# Altium schematic symbol library IC_ADI.SCHLIB: 3169 symbols (part 39 of 181) (continued)
## AD6657BBCZ (continued)

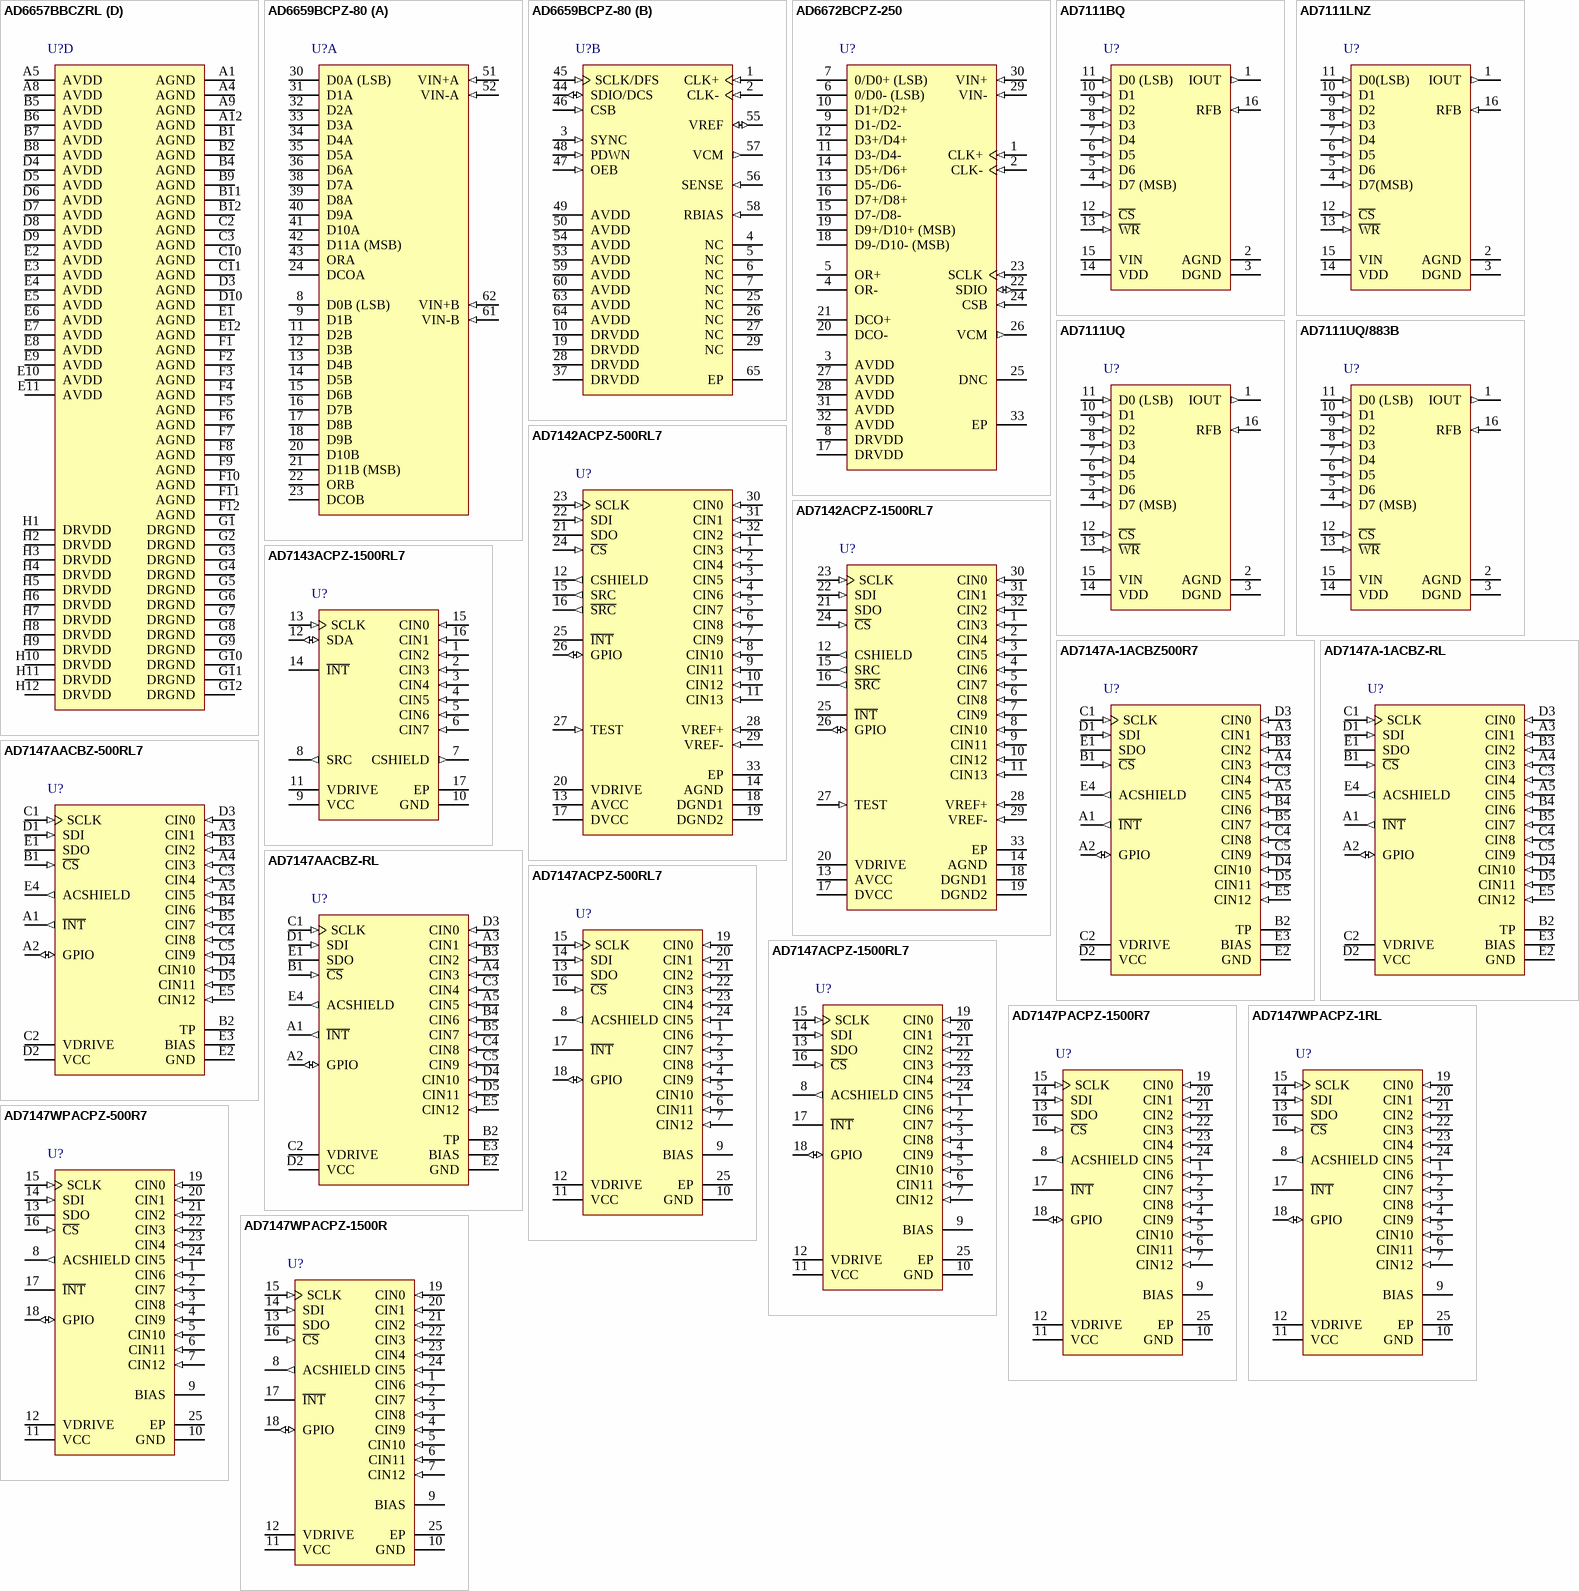
[diagram p35: symbols AD6657BBCZRL to AD7147WPACPZ-1500R]

## AD6657BBCZRL
designator U?
Quad 11-Bit IF Receiver with LVDS, Parallel Interface, 200MSPS, -40 to +85 degC, BC-144-1, Pb-Free, Reel; Generic Part Number: AD6657; PartNumber: AD6657BBCZRL; Resolution (Bits): 11; Channels: 4; Throughput Rate (SPS): 200M; DatasheetVersion: Rev.B; PackageVersion: 012006-0; PackageReference: BC-144-1; PackageDescription: 144-Ball Chip Scale Package Ball Grid Array [CSP_BGA]; Supplier Part Number 1: AD6657BBCZRL-ND; Supplier Part Number 2: 584-AD6657BBCZR; Interface: LVDS, Par; RoHS: Y; Packing: Reel; Mounting Technology: Surface Mount; Code_JEDEC: MO-205-AC; ComponentLink1Description: Manufacturer URL; ComponentLink2Description: Datasheet; ComponentLink3Description: Package Specification; ComponentLink4Description: Product URL
footprint BGA144_0.8(10X10) (Footprint not found)
part A pins: A10 VIN-B (in) "Differential Analog Input Pin (-) for Channel B", A11 VIN+B (in) "Differential Analog Input Pin (+) for Channel B", B10 VCMB (out) "Common-Mode Level Bias Output for Analog Input Channel B", C12 VIN+A (in) "Differential Analog Input Pin (+) for Channel A", D11 VCMA (out) "Common-Mode Level Bias Output for Analog Input Channel A", D12 VIN-A (in) "Differential Analog Input Pin (-) for Channel A", J7 D0-AB (hiz) "Channel A and Channel B LVDS Output Data 0--Complement", J8 D2-AB (hiz) "Channel A and Channel B LVDS Output Data 2--Complement", J9 D4-AB (hiz) "Channel A and Channel B LVDS Output Data 4--Complement", J10 D6-AB (hiz) "Channel A and Channel B LVDS Output Data 6--Complement", J11 D8-AB (hiz) "Channel A and Channel B LVDS Output Data 8--Complement", J12 D10-AB (hiz) "Channel A and Channel B LVDS Output Data 10--Complement", K7 D0+AB (hiz) "Channel A and Channel B LVDS Output Data 0--True", K8 D2+AB (hiz) "Channel A and Channel B LVDS Output Data 2--True", K9 D4+AB (hiz) "Channel A and Channel B LVDS Output Data 4--True", K10 D6+AB (hiz) "Channel A and Channel B LVDS Output Data 6--True", K11 D8+AB (hiz) "Channel A and Channel B LVDS Output Data 6--True", K12 D10+AB (hiz) "Channel A and Channel B LVDS Output Data 6--True", L7 D1-AB (hiz) "Channel A and Channel B LVDS Output Data 1--Complement", L8 D3-AB (hiz) "Channel A and Channel B LVDS Output Data 3--Complement", L9 D5-AB (hiz) "Channel A and Channel B LVDS Output Data 5--Complement", L10 D7-AB (hiz) "Channel A and Channel B LVDS Output Data 7--Complement", L11 D9-AB (hiz) "Channel A and Channel B LVDS Output Data 9--Complement", L12 DCO-AB (hiz) "Data Clock LVDS Output for Channel A and Channel B--Complement", M7 D1+AB (hiz) "Channel A and Channel B LVDS Output Data 1--True", M8 D3+AB (hiz) "Channel A and Channel B LVDS Output Data 3--True", M9 D5+AB (hiz) "Channel A and Channel B LVDS Output Data 5--True", M10 D7+AB (hiz) "Channel A and Channel B LVDS Output Data 7--True", M11 D9+AB (hiz) "Channel A and Channel B LVDS Output Data 9--True", M12 DCO+AB (hiz) "Data Clock LVDS Output for Channel A and Channel B--True"
part B pins: A2 VIN+C (in) "Differential Analog Input Pin (+) for Channel C", A3 VIN-C (in) "Differential Analog Input Pin (-) for Channel C", B3 VCMC (out) "Common-Mode Level Bias Output for Analog Input Channel C", C1 VIN+D (in) "Differential Analog Input Pin (+) for Channel D", D1 VIN-D (in) "Differential Analog Input Pin (-) for Channel D", D2 VCMD (out) "Common-Mode Level Bias Output for Analog Input Channel D", J1 D0-CD (hiz) "Channel C and Channel D LVDS Output Data 0--Complement", J2 D2-CD (hiz) "Channel C and Channel D LVDS Output Data 2--Complement", J3 D4-CD (hiz) "Channel C and Channel D LVDS Output Data 4--Complement", J4 D6-CD (hiz) "Channel C and Channel D LVDS Output Data 6--Complement", J5 D8-CD (hiz) "Channel C and Channel D LVDS Output Data 8--Complement", J6 D10-CD (hiz) "Channel C and Channel D LVDS Output Data 10--Complement", K1 D0+CD (hiz) "Channel C and Channel D LVDS Output Data 0--True", K2 D2+CD (hiz) "Channel C and Channel D LVDS Output Data 2--True", K3 D4+CD (hiz) "Channel C and Channel D LVDS Output Data 4--True", K4 D6+CD (hiz) "Channel C and Channel D LVDS Output Data 6--True", K5 D8+CD (hiz) "Channel C and Channel D LVDS Output Data 8--True", K6 D10+CD (hiz) "Channel C and Channel D LVDS Output Data 10--True", L1 D1-CD (hiz) "Channel C and Channel D LVDS Output Data 1--Complement", L2 D3-CD (hiz) "Channel C and Channel D LVDS Output Data 3--Complement", L3 D5-CD (hiz) "Channel C and Channel D LVDS Output Data 5--Complement", L4 D7-CD (hiz) "Channel C and Channel D LVDS Output Data 7--Complement", L5 D9-CD (hiz) "Channel C and Channel D LVDS Output Data 9--Complement", L6 DCO-CD (hiz) "Data Clock LVDS Output for Channel C and Channel D--Complement", M1 D1+CD (hiz) "Channel C and Channel D LVDS Output Data 1--True", M2 D3+CD (hiz) "Channel C and Channel D LVDS Output Data 3--True", M3 D5+CD (hiz) "Channel C and Channel D LVDS Output Data 5--True", M4 D7+CD (hiz) "Channel C and Channel D LVDS Output Data 7--True", M5 D9+CD (hiz) "Channel C and Channel D LVDS Output Data 9--True", M6 DCO+CD (hiz) "Data Clock LVDS Output for Channel C and Channel D--True"
part C pins: A6 CLK- (in) "ADC Clock Input--Complement", A7 CLK+ (in) "ADC Clock Input--True", C4 CSB (in) "SPI Chip Select (Active Low)", C5 SDIO (io) "SPI Data", C6 SCLK (in) "SPI Clock", C7 PDWN (in) "Power-Down Input (Active High)", C8 SYNC (in) "Digital Synchronization Pin", C9 MODE (in) "Mode Select Pin (Logic Low Enables NSR; Logic High Disables NSR)"
part D pins: A1 AGND (power) "Analog Ground", A4 AGND (power) "Analog Ground", A5 AVDD (power) "Analog Power Supply (1.8 V Nominal)", A8 AVDD (power) "Analog Power Supply (1.8 V Nominal)", A9 AGND (power) "Analog Ground", A12 AGND (power) "Analog Ground", B1 AGND (power) "Analog Ground", B2 AGND (power) "Analog Ground", B4 AGND (power) "Analog Ground", B5 AVDD (power) "Analog Power Supply (1.8 V Nominal)", B6 AVDD (power) "Analog Power Supply (1.8 V Nominal)", B7 AVDD (power) "Analog Power Supply (1.8 V Nominal)", B8 AVDD (power) "Analog Power Supply (1.8 V Nominal)", B9 AGND (power) "Analog Ground", B11 AGND (power) "Analog Ground", B12 AGND (power) "Analog Ground", C2 AGND (power) "Analog Ground", C3 AGND (power) "Analog Ground", C10 AGND (power) "Analog Ground", C11 AGND (power) "Analog Ground", D3 AGND (power) "Analog Ground", D4 AVDD (power) "Analog Power Supply (1.8 V Nominal)", D5 AVDD (power) "Analog Power Supply (1.8 V Nominal)", D6 AVDD (power) "Analog Power Supply (1.8 V Nominal)", D7 AVDD (power) "Analog Power Supply (1.8 V Nominal)", D8 AVDD (power) "Analog Power Supply (1.8 V Nominal)", D9 AVDD (power) "Analog Power Supply (1.8 V Nominal)", D10 AGND (power) "Analog Ground", E1 AGND (power) "Analog Ground", E2 AVDD (power) "Analog Power Supply (1.8 V Nominal)", E3 AVDD (power) "Analog Power Supply (1.8 V Nominal)", E4 AVDD (power) "Analog Power Supply (1.8 V Nominal)", E5 AVDD (power) "Analog Power Supply (1.8 V Nominal)", E6 AVDD (power) "Analog Power Supply (1.8 V Nominal)", E7 AVDD (power) "Analog Power Supply (1.8 V Nominal)", E8 AVDD (power) "Analog Power Supply (1.8 V Nominal)", E9 AVDD (power) "Analog Power Supply (1.8 V Nominal)", E10 AVDD (power) "Analog Power Supply (1.8 V Nominal)", E11 AVDD (power) "Analog Power Supply (1.8 V Nominal)", E12 AGND (power) "Analog Ground", F1 AGND (power) "Analog Ground", F2 AGND (power) "Analog Ground", F3 AGND (power) "Analog Ground", F4 AGND (power) "Analog Ground", F5 AGND (power) "Analog Ground", F6 AGND (power) "Analog Ground", F7 AGND (power) "Analog Ground", F8 AGND (power) "Analog Ground", F9 AGND (power) "Analog Ground", F10 AGND (power) "Analog Ground", F11 AGND (power) "Analog Ground", F12 AGND (power) "Analog Ground", G1 DRGND (power) "Digital Output Driver Ground", G2 DRGND (power) "Digital Output Driver Ground", G3 DRGND (power) "Digital Output Driver Ground", G4 DRGND (power) "Digital Output Driver Ground", G5 DRGND (power) "Digital Output Driver Ground", G6 DRGND (power) "Digital Output Driver Ground", G7 DRGND (power) "Digital Output Driver Ground", G8 DRGND (power) "Digital Output Driver Ground", G9 DRGND (power) "Digital Output Driver Ground", G10 DRGND (power) "Digital Output Driver Ground", G11 DRGND (power) "Digital Output Driver Ground", G12 DRGND (power) "Digital Output Driver Ground", H1 DRVDD (power) "Digital Output Driver Supply (1.8 V Nominal)", H2 DRVDD (power) "Digital Output Driver Supply (1.8 V Nominal)", H3 DRVDD (power) "Digital Output Driver Supply (1.8 V Nominal)", H4 DRVDD (power) "Digital Output Driver Supply (1.8 V Nominal)", H5 DRVDD (power) "Digital Output Driver Supply (1.8 V Nominal)", H6 DRVDD (power) "Digital Output Driver Supply (1.8 V Nominal)", H7 DRVDD (power) "Digital Output Driver Supply (1.8 V Nominal)", H8 DRVDD (power) "Digital Output Driver Supply (1.8 V Nominal)", H9 DRVDD (power) "Digital Output Driver Supply (1.8 V Nominal)", H10 DRVDD (power) "Digital Output Driver Supply (1.8 V Nominal)", H11 DRVDD (power) "Digital Output Driver Supply (1.8 V Nominal)", H12 DRVDD (power) "Digital Output Driver Supply (1.8 V Nominal)"

## AD6659BCPZ-80
designator U?
Dual 12-Bit IF Receiver with Parallel Interface, 80MSPS, -40 to +85 degC, CP-64-4, Pb-Free, Tray; Generic Part Number: AD6659; PartNumber: AD6659BCPZ-80; Resolution (Bits): 12; Channels: 2; Throughput Rate (SPS): 80M; Interface: Par; DatasheetVersion: Rev.A; PackageVersion: 051007-C; PackageReference: CP-64-4; PackageDescription: 64-Lead Lead Frame Chip Scale Package [LFCSP_VQ] 9 x 9 mm Body, Very Thin Quad; Supplier Part Number 1: AD6659BCPZ-80-ND; Supplier Part Number 2: 584-AD6659BCPZ-80; RoHS: Y; Packing: Tray; Mounting Technology: Surface Mount; Code_JEDEC: MO-220-VMMD-4; ComponentLink1Description: Manufacturer URL; ComponentLink2Description: Datasheet; ComponentLink3Description: Package Specification; ComponentLink4Description: Product URL
footprint QFN64_0.5-PAD(9X9) (Footprint not found)
part A pins: 8 D0B (LSB) (hiz) "Channel B Digital Outputs.  D0B is the LSB.", 9 D1B (hiz) "Channel B Digital Outputs.", 11 D2B (hiz) "Channel B Digital Outputs.", 12 D3B (hiz) "Channel B Digital Outputs.", 13 D4B (hiz) "Channel B Digital Outputs.", 14 D5B (hiz) "Channel B Digital Outputs.", 15 D6B (hiz) "Channel B Digital Outputs.", 16 D7B (hiz) "Channel B Digital Outputs.", 17 D8B (hiz) "Channel B Digital Outputs.", 18 D9B (hiz) "Channel B Digital Outputs.", 20 D10B (hiz) "Channel B Digital Outputs.", 21 D11B (MSB) (hiz) "Channel B Digital Outputs. D11B is the MSB.", 22 ORB (hiz) "Channel B Out-of-Range Digital Output.", 23 DCOB (hiz) "Channel B Data Clock Digital Output.", 24 DCOA (hiz) "Channel A Data Clock Digital Output.", 30 D0A (LSB) (hiz) "Channel A Digital Outputs.  D0A is the LSB.", 31 D1A (hiz) "Channel A Digital Outputs.", 32 D2A (hiz) "Channel A Digital Outputs.", 33 D3A (hiz) "Channel A Digital Outputs.", 34 D4A (hiz) "Channel A Digital Outputs.", 35 D5A (hiz) "Channel A Digital Outputs.", 36 D6A (hiz) "Channel A Digital Outputs.", 38 D7A (hiz) "Channel A Digital Outputs.", 39 D8A (hiz) "Channel A Digital Outputs.", 40 D9A (hiz) "Channel A Digital Outputs.", 41 D10A (hiz) "Channel A Digital Outputs.", 42 D11A (MSB) (hiz) "Channel A Digital Outputs. D11A is the MSB.", 43 ORA (hiz) "Channel A Out-of-Range Digital Output.", 51 VIN+A (in) "Channel A Analog Inputs.", 52 VIN-A (in) "Channel A Analog Inputs.", 61 VIN-B (in) "Channel B Analog Inputs.", 62 VIN+B (in) "Channel B Analog Inputs."
part B pins: 1 CLK+ (in) "Differential Encode Clock. PECL, LVDS, or 1.8 V CMOS inputs.", 2 CLK- (in) "Differential Encode Clock. PECL, LVDS, or 1.8 V CMOS inputs.", 3 SYNC (in) "Digital Input. SYNC input to clock divider. 30 k ohm internal pull-down", 4 NC "Do Not Connect.", 5 NC "Do Not Connect.", 6 NC "Do Not Connect.", 7 NC "Do Not Connect.", 10 DRVDD (power) "Digital Output Driver Supply (1.8 V to 3.3 V).", 19 DRVDD (power) "Digital Output Driver Supply (1.8 V to 3.3 V).", 25 NC "Do Not Connect.", 26 NC "Do Not Connect.", 27 NC "Do Not Connect.", 28 DRVDD (power) "Digital Output Driver Supply (1.8 V to 3.3 V).", 29 NC "Do Not Connect.", 37 DRVDD (power) "Digital Output Driver Supply (1.8 V to 3.3 V).", 44 SDIO/DCS (io) "SPI Data Input/Output (SDIO). The SDIO function provides bidirectional SPI data I/O in SPI mode with a 30 k ohm internal pull-down in SPI mode. The duty cycle stabilizer (DCS pin function) is the static enable input for the (See Datasheet)", 45 SCLK/DFS (in) "SPI Clock (SCLK) Input in SPI Mode/Data Format Select (DFS). 30 k ohm internal pull-down for both SCLK and DFS. The DFS function provides static control of data output format in non-SPI mode. When DFS is high, it equals twos (See Datasheet)", 46 CSB (in) "SPI Chip Select. Active low enable; 30 k ohm internal pull-up.", 47 OEB (in) "Digital Input. When OEB is low, it enables the Channel A and Channel B digital outputs; when OEB is high, the outputs are tristated. 30 k ohm internal pull-down.", 48 PDWN (in) "Digital Input. 30 kohm internal pull-down. When PDWN is high, it powers down the device. When PDWN is low, the device runs in normal operation.", 49 AVDD (power) "1.8 V Analog Supply Pins.", 50 AVDD (power) "1.8 V Analog Supply Pins.", 53 AVDD (power) "1.8 V Analog Supply Pins.", 54 AVDD (power) "1.8 V Analog Supply Pins.", 55 VREF (io) "Voltage Reference Input/Output.", 56 SENSE (in) "Reference Mode Selection.", 57 VCM (out) "Analog output voltage at midsupply to set common mode of the analog inputs.", 58 RBIAS (in) "Sets Analog Current Bias. Connect to a 10 k ohm (1% tolerance) resistor to ground.", 59 AVDD (power) "1.8 V Analog Supply Pins.", 60 AVDD (power) "1.8 V Analog Supply Pins.", 63 AVDD (power) "1.8 V Analog Supply Pins.", 64 AVDD (power) "1.8 V Analog Supply Pins.", 65 EP (power) "Exposed paddle is the only ground connection for the chip. It must be connected to the printed circuit board (PCB) AGND."

## AD6672BCPZ-250
designator U?
Single 11-Bit IF Receiver with LVDS Interface, 250MSPS, -40 to +85 degC, CP-32-12, Pb-Free, Tray; Generic Part Number: AD6672; PartNumber: AD6672BCPZ-250; Resolution (Bits): 11; Channels: 1; Throughput Rate (SPS): 250M; DatasheetVersion: Rev.0; PackageVersion: 020509-B; PackageReference: CP-32-12; PackageDescription: 32-Lead Lead Frame Chip Scale Package [LFCSP_WQ] 5 x 5 mm Body, Very Very Thin Quad; Supplier Part Number 1: AD6672BCPZ-250-ND; Supplier Part Number 2: 2009265; Supplier Part Number 3: 55T8938; Supplier Part Number 4: 584-AD6672BCPZ-250; Interface: LVDS; RoHS: Y; Packing: Tray; Mounting Technology: Surface Mount; Code_JEDEC: MO-220-WHHD; ComponentLink1Description: Manufacturer URL; ComponentLink2Description: Datasheet; ComponentLink3Description: Package Specification; ComponentLink4Description: Product URL
footprint QFN32_0.5-PAD(5X5) (Footprint not found)
pins: 1 CLK+ (in) "ADC Clock Input--True.", 2 CLK- (in) "ADC Clock Input--Complement.", 3 AVDD (power) "Analog Power Supply (1.8 V Nominal).", 4 OR- (hiz) "Overrange indicator--Complement.", 5 OR+ (hiz) "Overrange indicator--True.", 6 0/D0- (LSB) (hiz) "DDR LVDS Output Data 0--Complement. The output bit on the rising edge of the data clock output (DCO) from this output is always a Logic 0 (see Figure 2).", 7 0/D0+ (LSB) (hiz) "DDR LVDS Output Data 0--True. The output bit on the rising edge of the data clock output (DCO) from this output is always a Logic 0 (see Figure 2).", 8 DRVDD (power) "Digital Output Driver Supply (1.8 V Nominal).", 9 D1-/D2- (hiz) "DDR LVDS Output Data 1/2--Complement.", 10 D1+/D2+ (hiz) "DDR LVDS Output Data 1/2--True.", 11 D3-/D4- (hiz) "DDR LVDS Output Data 3/4--Complement.", 12 D3+/D4+ (hiz) "DDR LVDS Output Data 3/4--True.", 13 D5-/D6- (hiz) "DDR LVDS Output Data 5/6--Complement.", 14 D5+/D6+ (hiz) "DDR LVDS Output Data 5/6--True.", 15 D7-/D8- (hiz) "DDR LVDS Output Data 7/8--Complement.", 16 D7+/D8+ (hiz) "DDR LVDS Output Data 7/8--True.", 17 DRVDD (power) "Digital Output Driver Supply (1.8 V Nominal).", 18 D9-/D10- (MSB) (hiz) "DDR LVDS Output Data 9/10--Complement.", 19 D9+/D10+ (MSB) (hiz) "DDR LVDS Output Data 9/10--True.", 20 DCO- (hiz) "LVDS Data Clock Output--Complement.", 21 DCO+ (hiz) "LVDS Data Clock Output--True.", 22 SDIO (io) "SPI Serial Data I/O.", 23 SCLK (in) "SPI Serial Clock.", 24 CSB (in) "SPI Chip Select (Active Low).", 25 DNC "Do Not Connect. Do not connect to this pin.", 26 VCM (out) "Common-Mode Level Bias Output for Analog Inputs. This pin should be decoupled to ground using a 0.1 uF capacitor.", 27 AVDD (power) "Analog Power Supply (1.8 V Nominal).", 28 AVDD (power) "Analog Power Supply (1.8 V Nominal).", 29 VIN- (in) "Differential Analog Input Pin (-).", 30 VIN+ (in) "Differential Analog Input Pin (+).", 31 AVDD (power) "Analog Power Supply (1.8 V Nominal).", 32 AVDD (power) "Analog Power Supply (1.8 V Nominal).", 33 EP (power) "Analog Ground. The exposed thermal paddle on the bottom of the package provides the analog ground for the part. This exposed paddle must be connected to ground for proper operation."

## AD7111BQ
designator U?
Single LC2MOS Logarithmic Digital-to-Analog Converter, -40 to +85 degC, Q-16, Tube; Generic Part Number: AD7111; PartNumber: AD7111BQ; # DAC Outputs: 1; Max V+: 5V; Op Pwr Diss: 10mW; Resolution (Bits): 17; Single Supply: Yes; DatasheetVersion: Rev.0; PackageVersion: 1996; PackageReference: Q-16; PackageDescription: DIP, 16-Pin, Skinny Dual In-line Package, 300mil Wide, Pitch 2.54 mm; Supplier Part Number 1: AD7111BQ-ND; Supplier Part Number 2: 584-AD7111BQ; Packing: Tube; RoHS: N; Mounting Technology: Through Hole; ComponentLink1Description: Manufacturer URL; ComponentLink2Description: Datasheet; ComponentLink3Description: Package Specification; ComponentLink4Description: Product URL
footprint DIP16 (Footprint not found)
pins: 1 IOUT (out), 2 AGND (power), 3 DGND (power), 4 D7 (MSB) (in), 5 D6 (in), 6 D5 (in), 7 D4 (in), 8 D3 (in), 9 D2 (in), 10 D1 (in), 11 D0 (LSB) (in), 12 ~{CS} (in), 13 ~{WR} (in), 14 VDD (power), 15 VIN (power), 16 RFB (in)

## AD7111LNZ
designator U?
Single LC2MOS Logarithmic Digital-to-Analog Converter, 0 to +70 degC, N-16, Pb-Free, Tube; Generic Part Number: AD7111; PartNumber: AD7111LNZ; # DAC Outputs: 1; Max V+: 5V; Op Pwr Diss: 10mW; Resolution (Bits): 17; Single Supply: Yes; DatasheetVersion: Rev.0; PackageVersion: 070706-A; PackageReference: N-16; PackageDescription: 16-Lead Plastic Dual In-Line Package [PDIP] Narrow Body; Supplier Part Number 1: AD7111LNZ-ND; Supplier Part Number 2: 59K4547; Supplier Part Number 3: 584-AD7111LNZ; Packing: Tube; RoHS: Y; Mounting Technology: Through Hole; Code_JEDEC: MS-001; ComponentLink1Description: Manufacturer URL; ComponentLink2Description: Datasheet; ComponentLink3Description: Package Specification; ComponentLink4Description: Product URL
footprint DIP16 (Footprint not found)
pins: 1 IOUT (out), 2 AGND (power), 3 DGND (power), 4 D7(MSB) (in), 5 D6 (in), 6 D5 (in), 7 D4 (in), 8 D3 (in), 9 D2 (in), 10 D1 (in), 11 D0(LSB) (in), 12 ~{CS} (in), 13 ~{WR} (in), 14 VDD (power), 15 VIN (power), 16 RFB (in)

## AD7111UQ
designator U?
Single LC2MOS Logarithmic Digital-to-Analog Converter, -55 to +125 degC, Q-16, Tube; Generic Part Number: AD7111; PartNumber: AD7111UQ; # DAC Outputs: 1; Max V+: +5V; Op Pwr Diss: 10mW; Resolution (Bits): 17; Single Supply: Yes; DatasheetVersion: Rev.0; PackageVersion: 1996; PackageReference: Q-16; PackageDescription: DIP, 16-Pin, Skinny Dual In-line Package, 300mil Wide, Pitch 2.54 mm; Supplier Part Number 1: N/A; Packing: Tube; RoHS: N; Mounting Technology: Through Hole; ComponentLink1Description: Manufacturer URL; ComponentLink2Description: Datasheet; ComponentLink3Description: Package Specification; ComponentLink4Description: Product URL
footprint DIP16 (Footprint not found)
pins: 1 IOUT (out), 2 AGND (power), 3 DGND (power), 4 D7 (MSB) (in), 5 D6 (in), 6 D5 (in), 7 D4 (in), 8 D3 (in), 9 D2 (in), 10 D1 (in), 11 D0 (LSB) (in), 12 ~{CS} (in), 13 ~{WR} (in), 14 VDD (power), 15 VIN (power), 16 RFB (in)

## AD7111UQ/883B
designator U?
Single LC2MOS Logarithmic Digital-to-Analog Converter, -55 to +125 degC, Q-16, Tube; Generic Part Number: AD7111; PartNumber: AD7111UQ/883B; # DAC Outputs: 1; Max V+: 5V; Op Pwr Diss: 10mW; Resolution (Bits): 17; Single Supply: Yes; DatasheetVersion: Rev.0; PackageVersion: 1996; PackageReference: Q-16; PackageDescription: DIP, 16-Pin, Skinny Dual In-line Package, 300mil Wide, Pitch 2.54 mm; Supplier Part Number 1: 584-AD7111UQ883B; Packing: Tube; RoHS: N; Mounting Technology: Through Hole; ComponentLink1Description: Manufacturer URL; ComponentLink2Description: Datasheet; ComponentLink3Description: Package Specification; ComponentLink4Description: Product URL
footprint DIP16 (Footprint not found)
pins: 1 IOUT (out), 2 AGND (power), 3 DGND (power), 4 D7 (MSB) (in), 5 D6 (in), 6 D5 (in), 7 D4 (in), 8 D3 (in), 9 D2 (in), 10 D1 (in), 11 D0 (LSB) (in), 12 ~{CS} (in), 13 ~{WR} (in), 14 VDD (power), 15 VIN (power), 16 RFB (in)

## AD7142ACPZ-500RL7
designator U?
Programmable Controller for Capacitance Touch Sensors with I2C/Serial 2-Wire, Serial, SPI Interface, 27.8kSPS, -40 to +85 degC, CP-32-2, Pb-Free, Reel; Generic Part Number: AD7142; PartNumber: AD7142ACPZ-500RL7; Resolution (Bits): 16; Channels: 14; Throughput Rate (SPS): 27.8; Interface: I2C/Ser 2-Wire, Ser, SPI; DatasheetVersion: Rev.A; PackageVersion: Jan-2005; PackageReference: CP-32-2; PackageDescription: 32-Lead Lead Frame Chip Scale Package [LFCSP_VQ] 5 x 5 mm Body, Very Thin Quad; Supplier Part Number 1: AD7142ACPZ-500RL7TR-ND; Supplier Part Number 2: AD7142ACPZ-500RL7CT-ND; Supplier Part Number 3: AD7142ACPZ-500RL7DKR-ND; Supplier Part Number 4: 584-AD7142ACPZ-500R7; RoHS: Y; Packing: Reel; Mounting Technology: Surface Mount; Code_JEDEC: MO-220-VHHD-2; ComponentLink1Description: Manufacturer URL; ComponentLink2Description: Datasheet; ComponentLink3Description: Package Specification; ComponentLink4Description: Product URL
footprint QFN32_0.5-PAD(5X5) (Footprint not found)
pins: 1 CIN3 (in) "Capacitance Sensor Input.", 2 CIN4 (in) "Capacitance Sensor Input.", 3 CIN5 (in) "Capacitance Sensor Input.", 4 CIN6 (in) "Capacitance Sensor Input.", 5 CIN7 (in) "Capacitance Sensor Input.", 6 CIN8 (in) "Capacitance Sensor Input.", 7 CIN9 (in) "Capacitance Sensor Input.", 8 CIN10 (in) "Capacitance Sensor Input.", 9 CIN11 (in) "Capacitance Sensor Input.", 10 CIN12 (in) "Capacitance Sensor Input.", 11 CIN13 (in) "Capacitance Sensor Input.", 12 CSHIELD (out) "CDC Shield Potential Output. Requires 10 nF capacitor to ground. Connect to external shield.", 13 AVCC (power) "CDC Supply Voltage.", 14 AGND (power) "Analog Ground Reference Point for All CDC Circuitry. Tie to analog ground plane.", 15 SRC (out) "CDC Excitation Source Output.", 16 ~{SRC} (out) "Inverted Excitation Source Output.", 17 DVCC (power) "Digital Core Supply Voltage.", 18 DGND1 (power) "Digital Ground.", 19 DGND2 (power) "Digital Ground.", 20 VDRIVE (power) "Serial Interface Operating Voltage Supply.", 21 SDO (hiz) "SPI Serial Data Output.", 22 SDI (in) "SPI Serial Data Input.", 23 SCLK (in) "Clock Input for Serial Interface.", 24 ~{CS} (in) "SPI Chip Select Signal.", 25 ~{INT} (oc) "General-Purpose Open-Drain Interrupt Output. Programmable polarity; requires pull-up resistor.", 26 GPIO (io) "Programmable GPIO.", 27 TEST (in) "Factory Test Pin. Tie to ground.", 28 VREF+ (in) "CDC Positive Reference Input. Normally tied to analog power.", 29 VREF- (in) "CDC Negative Reference Input. Tie to analog ground.", 30 CIN0 (in) "Capacitance Sensor Input.", 31 CIN1 (in) "Capacitance Sensor Input.", 32 CIN2 (in) "Capacitance Sensor Input.", 33 EP (power) "Exposed Paddle."

## AD7142ACPZ-1500RL7
designator U?
Programmable Controller for Capacitance Touch Sensors with I2C/Serial 2-Wire, Serial, SPI Interface, 27.8kSPS, -40 to +85 degC, CP-32-2, Pb-Free, Reel; Generic Part Number: AD7142; PartNumber: AD7142ACPZ-1500RL7; Resolution (Bits): 16; Channels: 14; Throughput Rate (SPS): 27.8; Interface: I2C/Ser 2-Wire, Ser, SPI; DatasheetVersion: Rev.A; PackageVersion: Jan-2005; PackageReference: CP-32-2; PackageDescription: 32-Lead Lead Frame Chip Scale Package [LFCSP_VQ] 5 x 5 mm Body, Very Thin Quad; Supplier Part Number 1: AD7142ACPZ-1500RL7TR-ND; Supplier Part Number 2: AD7142ACPZ-1500RL7CT-ND; Supplier Part Number 3: AD7142ACPZ-1500RL7DKR-ND; Supplier Part Number 4: 584-AD7142ACPZ1500R7; RoHS: Y; Packing: Reel; Mounting Technology: Surface Mount; Code_JEDEC: MO-220-VHHD-2; ComponentLink1Description: Manufacturer URL; ComponentLink2Description: Datasheet; ComponentLink3Description: Package Specification; ComponentLink4Description: Product URL
footprint QFN32_0.5-PAD(5X5) (Footprint not found)
pins: 1 CIN3 (in) "Capacitance Sensor Input.", 2 CIN4 (in) "Capacitance Sensor Input.", 3 CIN5 (in) "Capacitance Sensor Input.", 4 CIN6 (in) "Capacitance Sensor Input.", 5 CIN7 (in) "Capacitance Sensor Input.", 6 CIN8 (in) "Capacitance Sensor Input.", 7 CIN9 (in) "Capacitance Sensor Input.", 8 CIN10 (in) "Capacitance Sensor Input.", 9 CIN11 (in) "Capacitance Sensor Input.", 10 CIN12 (in) "Capacitance Sensor Input.", 11 CIN13 (in) "Capacitance Sensor Input.", 12 CSHIELD (out) "CDC Shield Potential Output. Requires 10 nF capacitor to ground. Connect to external shield.", 13 AVCC (power) "CDC Supply Voltage.", 14 AGND (power) "Analog Ground Reference Point for All CDC Circuitry. Tie to analog ground plane.", 15 SRC (out) "CDC Excitation Source Output.", 16 ~{SRC} (out) "Inverted Excitation Source Output.", 17 DVCC (power) "Digital Core Supply Voltage.", 18 DGND1 (power) "Digital Ground.", 19 DGND2 (power) "Digital Ground.", 20 VDRIVE (power) "Serial Interface Operating Voltage Supply.", 21 SDO (hiz) "SPI Serial Data Output.", 22 SDI (in) "SPI Serial Data Input.", 23 SCLK (in) "Clock Input for Serial Interface.", 24 ~{CS} (in) "SPI Chip Select Signal.", 25 ~{INT} (oc) "General-Purpose Open-Drain Interrupt Output. Programmable polarity; requires pull-up resistor.", 26 GPIO (io) "Programmable GPIO.", 27 TEST (in) "Factory Test Pin. Tie to ground.", 28 VREF+ (in) "CDC Positive Reference Input. Normally tied to analog power.", 29 VREF- (in) "CDC Negative Reference Input. Tie to analog ground.", 30 CIN0 (in) "Capacitance Sensor Input.", 31 CIN1 (in) "Capacitance Sensor Input.", 32 CIN2 (in) "Capacitance Sensor Input.", 33 EP (power) "Exposed Paddle."

## AD7143ACPZ-1500RL7
designator U?
Programmable Controller for Capacitance Touch Sensors with I2C/Ser 2-Wire, Serial Interface, 43.5SPS, -40 to +85 degC, CP-16-13, Pb-Free, Reel; Generic Part Number: AD7143; PartNumber: AD7143ACPZ-1500RL7; Resolution (Bits): 16; Channels: 8; Throughput Rate (SPS): 43.5; DatasheetVersion: Rev.0; PackageVersion: 031006-A; PackageReference: CP-16-13; PackageDescription: 16-Lead Lead Frame Chip Scale Package [LFCSP_VQ] 4 x 4 mm Body, Very Thin Quad; Supplier Part Number 1: AD7143ACPZ-1500RL7TR-ND; Supplier Part Number 2: AD7143ACPZ-1500RL7CT-ND; Supplier Part Number 3: AD7143ACPZ-1500RL7DKR-ND; Supplier Part Number 4: 584-AD7143ACPZ1500R7; Interface: I2C/Ser 2-Wire, Ser; RoHS: Y; Packing: Reel; Mounting Technology: Surface Mount; Code_JEDEC: MO-220-VGGC; ComponentLink1Description: Manufacturer URL; ComponentLink2Description: Datasheet; ComponentLink3Description: Package Specification; ComponentLink4Description: Product URL
footprint QFN16_0.65-PAD(4x4) (Footprint not found)
pins: 1 CIN2 (in) "Capacitance Sensor Input.", 2 CIN3 (in) "Capacitance Sensor Input.", 3 CIN4 (in) "Capacitance Sensor Input.", 4 CIN5 (in) "Capacitance Sensor Input.", 5 CIN6 (in) "Capacitance Sensor Input.", 6 CIN7 (in) "Capacitance Sensor Input.", 7 CSHIELD (out) "CDC Shield Potential Output. Requires 10 nF capacitor to ground.", 8 SRC (out) "CDC Excitation Source Output.", 9 VCC (power) "CDC Supply Voltage.", 10 GND (power) "Ground Reference Point for All CDC Circuitry. Tie to ground plane.", 11 VDRIVE (power) "I2C Serial Interface Operating Voltage", 12 SDA (io) "I2C Serial Data Input/Output. SDA requires pull-up resistor", 13 SCLK (in) "Clock Input for Serial Interface. SCLK requires pull-up resistor.", 14 ~{INT} (oc) "General-Purpose Open-Drain Interrupt Output. Programmable polarity; requires pull-up resistor.", 15 CIN0 (in) "Capacitance Sensor Input.", 16 CIN1 (in) "Capacitance Sensor Input.", 17 EP (power) "Exposed pad"